# Altium footprint library ref-packages.PCBLIB: 1544 footprints (part 38 of 103)
Each footprint in its own frame and in the unit in brackets; x right, y up, seen from the top. Pads: shape width x height; smd on the part's side, far side on the other; paste and mask are expansions set on the pad; w line width, h text height; cw(c..) or ccw(c..) is an arc to the next point about the centre after c.
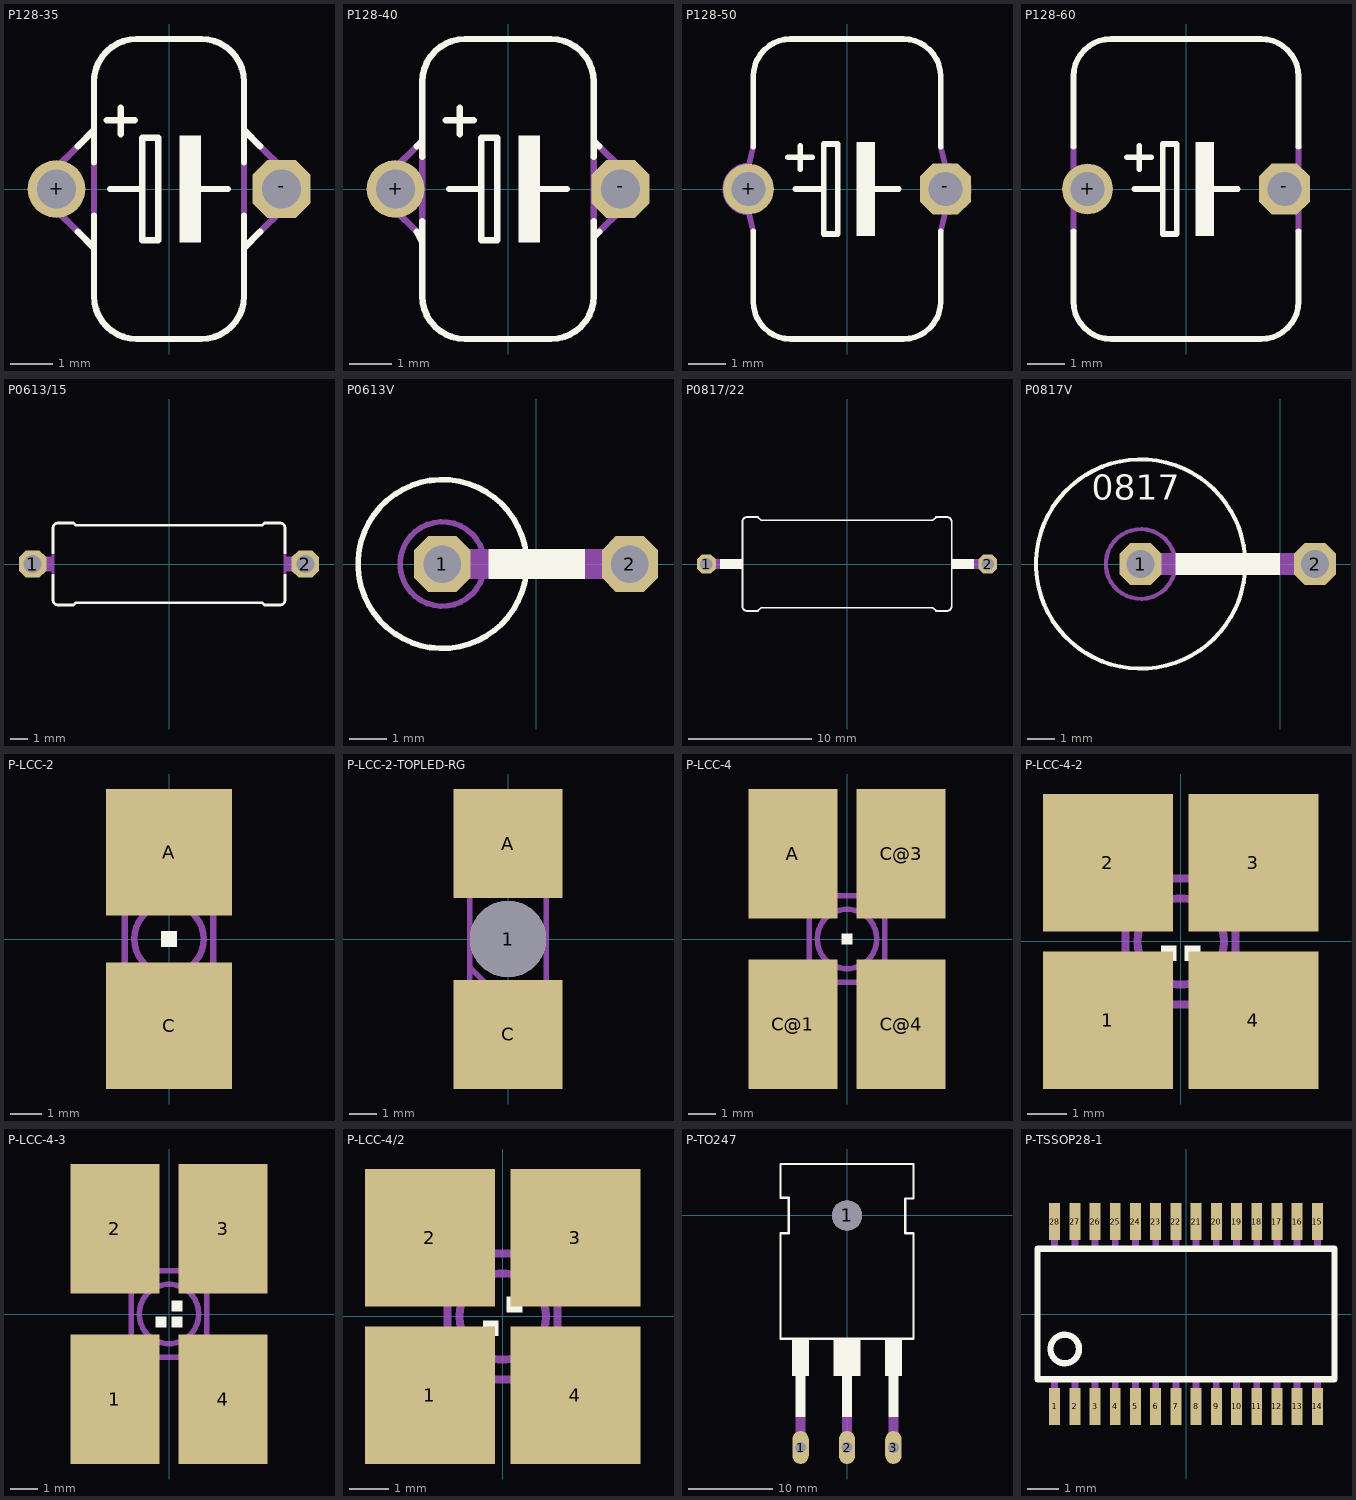
[diagram p37: the footprints below, top view; thin cyan lines are the x and y axes]

## P128-35 [mil]
pads (2):
  round 54 hole 36: +(-105,0)
  oct 54x54 hole 36: -(105,0)
Top Overlay:
  rectangle: 10,-50 30,50
  lines w6: -85,-40 -70,-55 ; -85,40 -70,55 ; -70,-25 -70,-55 ; -70,25 -70,55 ; -70,105 -70,100 ; -58,64 -32,64 ; -55,0 -25,0 ; -45,51 -45,76 ; 25,0 55,0 ; 70,-25 70,-55 ; 70,25 70,55 ; 85,-40 70,-55 ; 85,40 70,55 ; -70,-55 -70,-100 ccw(c-30,-100) -30,-140 30,-140 ccw(c30,-100) 70,-100 70,-55 ; -70,55 -70,100 ; -70,100 cw(c-30,100) -30,140 30,140 cw(c30,100) 70,100 70,55 ; -25,0 -25,-48 -10,-48 -10,48 -25,48 -25,0
Mechanical 16:
  lines w6: -85,-40 -105,-20 cw(c-105,0) -105,20 -85,40 ; -70,-25 -70,25 ; 70,-25 70,25 ; 85,-40 105,-20 ccw(c105,0) 105,20 85,40

## P128-40 [mil]
pads (2):
  round 54 hole 36: +(-105,0)
  oct 54x54 hole 36: -(105,0)
Top Overlay:
  rectangle: 10,-50 30,50
  lines w6: -85,-40 -80,-50 ; -85,40 -80,45 ; -80,-30 -80,-50 ; -80,30 -80,45 ; -58,64 -32,64 ; -55,0 -25,0 ; -45,51 -45,76 ; 25,0 55,0 ; 80,-30 80,-45 ; 80,30 80,45 ; 85,-40 80,-45 ; 85,40 80,45 ; -80,-50 -80,-100 ccw(c-40,-100) -40,-140 40,-140 ccw(c40,-100) 80,-100 80,-45 ; -80,45 -80,100 cw(c-40,100) -40,140 40,140 cw(c40,100) 80,100 80,45 ; -25,0 -25,-48 -10,-48 -10,48 -25,48 -25,0
Mechanical 16:
  lines w6: -85,-40 -105,-20 cw(c-105,0) -105,20 -85,40 ; -80,-30 -80,30 ; 80,-30 80,30 ; 85,-40 105,-20 ccw(c105,0) 105,20 85,40

## P128-50 [mil]
pads (2):
  round 54 hole 36: +(-105,0)
  oct 54x54 hole 36: -(105,0)
Top Overlay:
  rectangle: 10,-50 30,50
  lines w6: -100,-45 -100,-120 ccw(c-60,-120) -60,-160 60,-160 ccw(c60,-120) 100,-120 100,-45 ; -100,45 -100,120 cw(c-60,120) -60,160 60,160 cw(c60,120) 100,120 100,45 ; -63,34 -37,34 ; -55,0 -25,0 ; -50,21 -50,46 ; 25,0 55,0 ; -25,0 -25,-48 -10,-48 -10,48 -25,48 -25,0
Mechanical 16:
  lines w6: -100,-45 -105,-25 cw(c-105,0) -105,25 -100,45 ; 100,-45 105,-25 ccw(c105,0) 105,25 100,45

## P128-60 [mil]
pads (2):
  round 54 hole 36: +(-105,0)
  oct 54x54 hole 36: -(105,0)
Top Overlay:
  rectangle: 10,-50 30,50
  lines w6: -120,-45 -120,-120 ccw(c-80,-120) -80,-160 80,-160 ccw(c80,-120) 120,-120 120,-45 ; -120,45 -120,120 cw(c-80,120) -80,160 80,160 cw(c80,120) 120,120 120,45 ; -63,34 -37,34 ; -55,0 -25,0 ; -50,21 -50,46 ; 25,0 55,0 ; -25,0 -25,-48 -10,-48 -10,48 -25,48 -25,0
Mechanical 16:
  lines w6: -120,-45 -120,45 ; 120,-45 120,45

## P0613/15 [mil]
pads (2):
  oct 60x60 hole 40: 1(-300,0) 2(300,0)
Top Overlay:
  lines w6: -255,-25 -255,-80 ccw(c-245,-80) -245,-90 -210,-90 -205,-85 205,-85 210,-90 245,-90 ccw(c245,-80) 255,-80 255,-25 ; -255,25 -255,80 cw(c-245,80) -245,90 -210,90 -205,85 205,85 210,90 245,90 cw(c245,80) 255,80 255,25
Mechanical 16:
  rectangle: -277,-16 -255,16
  rectangle: 255,-16 277,16
  lines w6: -255,-25 -255,25 ; 255,-25 255,25
  lines w32: -300,0 -275,0 ; 275,0 300,0

## P0613V [mil]
pads (2):
  oct 60x60 hole 40: 1(-100,0) 2(100,0)
Top Overlay:
  circle w6: c-100,0 r90
  rectangle: -51,-16 52,16
Mechanical 16:
  circle w6: c-100,0 r45
  lines w32: -100,0 -55,0 ; 55,0 100,0

## P0817/22 [mil]
pads (2):
  oct 60x60 hole 40: 1(-450,0) 2(450,0)
Top Overlay:
  rectangle: 335,-16 406,16
  rectangle: -406,-16 -335,16
  lines w6: -335,-135 -335,135 cw(c-320,135) -320,150 -285,150 -275,140 275,140 285,150 320,150 cw(c320,135) 335,135 335,-135 cw(c320,-135) 320,-150 285,-150 275,-140 -275,-140 -285,-150 -320,-150 cw(c-320,-135) -335,-135
Mechanical 16:
  lines w32: -450,0 -410,0 ; 410,0 450,0
  text "0817" at 260,-89 h77.5

## P0817V [mil]
pads (2):
  oct 60x60 hole 40: 1(-200,0) 2(50,0)
Top Overlay:
  circle w6: c-200,0 r150
  rectangle: -150,-16 0,16
  text "0817" at -270,80 h62
Mechanical 16:
  circle w6: c-200,0 r50
  lines w32: -200,0 -150,0 ; 0,0 50,0

## P-LCC-2 [mm]
pads (2):
  rect 4x4 smd: A(0,2.75) C(0,-2.75)
Top Overlay:
  rectangle: -0.25,-0.25 0.25,0.25
  text "A" at -0.635,2.54 h1.97
  text "C" at -0.635,-3.81 h1.97
Top Paste:
  rectangle: -1.3,-2.25 1.3,-0.75
  rectangle: -1.3,0.75 1.3,2.25
Mechanical 16:
  circle w0.203: c0,0 r1.1
  lines w0.102: -1.1,-1.6 -1.1,-1.8 1.1,-1.8 1.1,-1.6 ; -1.1,1.6 -1.1,1.8 1.1,1.8 1.1,1.6
  lines w0.203: -1.4,-1.05 -1.4,-1.6 -1.1,-1.6 -0.85,-1.6 ; -1.4,-1.05 -0.85,-1.6 ; -1.4,-1.05 -1.4,1.6 -1.1,1.6 1.1,1.6 1.4,1.6 1.4,-1.6 1.1,-1.6 -0.85,-1.6

## P-LCC-2-TOPLED-RG [mm]
pads (3):
  round 2.8 hole 2.8: 1(0,0)
  rect 4x4 smd: A(0,3.5) C(0,-3.5)
Top Overlay:
  circle w0.203: c0,0 r1.1
  rectangle: -0.25,-0.25 0.25,0.25
  text "A" at -0.635,3.29 h1.97
  text "C" at -0.635,-4.56 h1.97
Top Paste:
  rectangle: -1.3,-3 1.3,-1.5
  rectangle: -1.3,1.5 1.3,3
Mechanical 16:
  rectangle: -1.15,2.4 1.15,2.7
  rectangle: -1.15,-2.7 1.15,-2.4
  lines w0.102: -1.1,-2.45 -1.1,-1.6 ; -1.1,1.6 -1.1,2.45 ; 1.1,-2.45 1.1,-1.6 ; 1.1,1.6 1.1,2.45
  lines w0.203: -1.4,-1.05 -1.4,-1.6 -1.1,-1.6 -0.85,-1.6 ; -1.4,-1.05 -0.85,-1.6 ; -1.4,-1.05 -1.4,1.6 -1.1,1.6 1.1,1.6 1.4,1.6 1.4,-1.6 1.1,-1.6 -0.85,-1.6

## P-LCC-4 [mm]
pads (4):
  rect 3.3x4.8 smd: A(-2,3.15) C@1(-2,-3.15) C@3(2,3.15) C@4(2,-3.15)
Top Overlay:
  rectangle: -0.2,-0.2 0.2,0.2
Top Paste:
  rectangle: -1.1,-1.8 -0.4,-0.8
  rectangle: 0.4,-1.8 1.1,-0.8
  rectangle: 0.4,0.8 1.1,1.8
  rectangle: -1.1,0.8 -0.4,1.8
Top Solder:
  rectangle: -1.15,0.75 -0.35,1.85
  rectangle: 0.35,0.75 1.15,1.85
  rectangle: 0.35,-1.85 1.15,-0.75
  rectangle: -1.15,-1.85 -0.35,-0.75
Mechanical 16:
  circle w0.203: c0,0 r1.1
  lines w0.102: -1,-1.6 -1,-1.8 -0.5,-1.8 -0.5,-1.65 ; -1,1.6 -1,1.8 -0.5,1.8 -0.5,1.65 ; 0.5,-1.65 0.5,-1.8 1,-1.8 1,-1.6 ; 0.5,1.65 0.5,1.8 1.1,1.8 1.1,1.6
  lines w0.203: -1.4,-1.05 -1.4,-1.6 -1,-1.6 -0.85,-1.6 ; -1.4,-1.05 -0.85,-1.6 ; -1.4,-1.05 -1.4,1.6 -1,1.6 1.1,1.6 1.4,1.6 1.4,-1.6 1,-1.6 -0.85,-1.6
  text "C" at -1.905,-3.81 h1.97
  text "A" at -1.905,2.54 h1.97
  text "C" at 1.27,2.54 h1.97
  text "C" at 1.27,-3.81 h1.97

## P-LCC-4-2 [mm]
pads (4):
  rect 3.3x3.5 smd: 1(-1.85,-2) 2(-1.85,2) 3(1.85,2) 4(1.85,-2)
Top Overlay:
  rectangle: 0.1,-0.5 0.5,-0.1
  rectangle: -0.5,-0.5 -0.1,-0.1
  text "1" at -2.54,-2.54 h1.97
  text "2" at -2.54,1.905 h1.97
  text "3" at 1.905,1.905 h1.97
  text "4" at 1.905,-2.54 h1.97
Top Paste:
  rectangle: -1.1,-1.8 -0.4,-0.8
  rectangle: 0.4,-1.8 1.1,-0.8
  rectangle: 0.4,0.8 1.1,1.8
  rectangle: -1.1,0.8 -0.4,1.8
Top Solder:
  rectangle: -1.15,0.75 -0.35,1.85
  rectangle: 0.35,0.75 1.15,1.85
  rectangle: 0.35,-1.85 1.15,-0.75
  rectangle: -1.15,-1.85 -0.35,-0.75
Mechanical 16:
  circle w0.203: c0,0 r1.1
  lines w0.102: -1,-1.6 -1,-1.8 -0.5,-1.8 -0.5,-1.65 ; -1,1.6 -1,1.8 -0.5,1.8 -0.5,1.65 ; 0.5,-1.65 0.5,-1.8 1,-1.8 1,-1.6 ; 0.5,1.65 0.5,1.8 1.1,1.8 1.1,1.6
  lines w0.203: -1.4,-1.05 -1.4,-1.6 -1,-1.6 -0.85,-1.6 ; -1.4,-1.05 -0.85,-1.6 ; -1.4,-1.05 -1.4,1.6 -1,1.6 1.1,1.6 1.4,1.6 1.4,-1.6 1,-1.6 -0.85,-1.6

## P-LCC-4-3 [mm]
pads (4):
  rect 3.3x4.8 smd: 1(-2,-3.15) 2(-2,3.15) 3(2,3.15) 4(2,-3.15)
Top Overlay:
  rectangle: 0.1,0.1 0.5,0.5
  rectangle: 0.1,-0.5 0.5,-0.1
  rectangle: -0.5,-0.5 -0.1,-0.1
  text "1" at -1.905,-3.81 h1.97
  text "2" at -1.905,2.54 h1.97
  text "3" at 1.27,2.54 h1.97
  text "4" at 1.27,-3.81 h1.97
Top Paste:
  rectangle: -1.1,-1.8 -0.4,-0.8
  rectangle: 0.4,-1.8 1.1,-0.8
  rectangle: 0.4,0.8 1.1,1.8
  rectangle: -1.1,0.8 -0.4,1.8
Top Solder:
  rectangle: -1.15,0.75 -0.35,1.85
  rectangle: 0.35,0.75 1.15,1.85
  rectangle: 0.35,-1.85 1.15,-0.75
  rectangle: -1.15,-1.85 -0.35,-0.75
Mechanical 16:
  circle w0.203: c0,0 r1.1
  lines w0.102: -1,-1.6 -1,-1.8 -0.5,-1.8 -0.5,-1.65 ; -1,1.6 -1,1.8 -0.5,1.8 -0.5,1.65 ; 0.5,-1.65 0.5,-1.8 1,-1.8 1,-1.6 ; 0.5,1.65 0.5,1.8 1.1,1.8 1.1,1.6
  lines w0.203: -1.4,-1.05 -1.4,-1.6 -1,-1.6 -0.85,-1.6 ; -1.4,-1.05 -0.85,-1.6 ; -1.4,-1.05 -1.4,1.6 -1,1.6 1.1,1.6 1.4,1.6 1.4,-1.6 1,-1.6 -0.85,-1.6

## P-LCC-4/2 [mm]
pads (4):
  rect 3.3x3.5 smd: 1(-1.85,-2) 2(-1.85,2) 3(1.85,2) 4(1.85,-2)
Top Overlay:
  rectangle: 0.1,0.1 0.5,0.5
  rectangle: -0.5,-0.5 -0.1,-0.1
  text "1" at -2.54,-2.54 h1.97
  text "2" at -2.54,1.905 h1.97
  text "3" at 1.905,1.905 h1.97
  text "4" at 1.905,-2.54 h1.97
Top Paste:
  rectangle: -1.1,-1.8 -0.4,-0.8
  rectangle: 0.4,-1.8 1.1,-0.8
  rectangle: 0.4,0.8 1.1,1.8
  rectangle: -1.1,0.8 -0.4,1.8
Top Solder:
  rectangle: -1.15,0.75 -0.35,1.85
  rectangle: 0.35,0.75 1.15,1.85
  rectangle: 0.35,-1.85 1.15,-0.75
  rectangle: -1.15,-1.85 -0.35,-0.75
Mechanical 16:
  circle w0.203: c0,0 r1.1
  lines w0.102: -1,-1.6 -1,-1.8 -0.5,-1.8 -0.5,-1.65 ; -1,1.6 -1,1.8 -0.5,1.8 -0.5,1.65 ; 0.5,-1.65 0.5,-1.8 1,-1.8 1,-1.6 ; 0.5,1.65 0.5,1.8 1.1,1.8 1.1,1.6
  lines w0.203: -1.4,-1.05 -1.4,-1.6 -1,-1.6 -0.85,-1.6 ; -1.4,-1.05 -0.85,-1.6 ; -1.4,-1.05 -1.4,1.6 -1,1.6 1.1,1.6 1.4,1.6 1.4,-1.6 1,-1.6 -0.85,-1.6

## P-TO247 [mil]
pads (4):
  oval 76.77x153.54 hole 51.18: 1(-216.54,-1082.68) 2(0,-1082.68) 3(216.54,-1082.68)
  round 141.73 hole 141.73: 1(0,0)
Top Overlay:
  rectangle: -62.99,-748.03 62.99,-578.74
  rectangle: -255.91,-748.03 -177.17,-578.74
  rectangle: 177.17,-748.03 255.91,-578.74
  rectangle: -240.16,-940.94 -192.91,-748.03
  rectangle: -23.62,-940.94 23.62,-748.03
  rectangle: 192.91,-940.94 240.16,-748.03
  lines w10: -311.02,-574.8 311.02,-574.8 311.02,-82.68 271.65,-82.68 271.65,78.74 311.02,78.74 311.02,240.16 -311.02,240.16 -311.02,82.68 -271.65,82.68 -271.65,-82.68 -311.02,-82.68 -311.02,-574.8
Mechanical 16:
  rectangle: -23.62,-1082.68 23.62,-940.94
  rectangle: 192.91,-1082.68 240.16,-940.94
  rectangle: -240.16,-1082.68 -192.91,-940.94

## P-TSSOP28-1 [mm]
pads (28):
  rect 0.35x1.2 smd: 1(-4.225,-2.975) 2(-3.575,-2.975) 3(-2.925,-2.975) 4(-2.275,-2.975) 5(-1.625,-2.975) 6(-0.975,-2.975) 7(-0.325,-2.975) 8(0.325,-2.975) 9(0.975,-2.975) 10(1.625,-2.975) 11(2.275,-2.975) 12(2.925,-2.975) 13(3.575,-2.975) 14(4.225,-2.975) 15(4.225,2.975) 16(3.575,2.975) 17(2.925,2.975) 18(2.275,2.975) 19(1.625,2.975) 20(0.975,2.975) 21(0.325,2.975) 22(-0.325,2.975) 23(-0.975,2.975) 24(-1.625,2.975) 25(-2.275,2.975) 26(-2.925,2.975) 27(-3.575,2.975) 28(-4.225,2.975)
Top Overlay:
  circle w0.203: c-3.9,-1.125 r0.459
  lines w0.203: -4.775,-2.1 4.775,-2.1 4.775,2.1 -4.775,2.1 -4.775,-2.1
Mechanical 16:
  rectangle: -4.335,-3.2 -4.115,-2.17
  rectangle: -3.685,-3.2 -3.465,-2.17
  rectangle: -3.035,-3.2 -2.815,-2.17
  rectangle: -2.385,-3.2 -2.165,-2.17
  rectangle: -1.735,-3.2 -1.515,-2.17
  rectangle: -1.085,-3.2 -0.865,-2.17
  rectangle: -0.435,-3.2 -0.215,-2.17
  rectangle: 0.215,-3.2 0.435,-2.17
  rectangle: 0.865,-3.2 1.085,-2.17
  rectangle: 1.515,-3.2 1.735,-2.17
  rectangle: 2.165,-3.2 2.385,-2.17
  rectangle: 2.815,-3.2 3.035,-2.17
  rectangle: 3.465,-3.2 3.685,-2.17
  rectangle: 4.115,-3.2 4.335,-2.17
  rectangle: 4.115,2.17 4.335,3.2
  rectangle: 3.465,2.17 3.685,3.2
  rectangle: 2.815,2.17 3.035,3.2
  rectangle: 2.165,2.17 2.385,3.2
  rectangle: 1.515,2.17 1.735,3.2
  rectangle: 0.865,2.17 1.085,3.2
  rectangle: 0.215,2.17 0.435,3.2
  rectangle: -0.435,2.17 -0.215,3.2
  rectangle: -1.085,2.17 -0.865,3.2
  rectangle: -1.735,2.17 -1.515,3.2
  rectangle: -2.385,2.17 -2.165,3.2
  rectangle: -3.035,2.17 -2.815,3.2
  rectangle: -3.685,2.17 -3.465,3.2
  rectangle: -4.335,2.17 -4.115,3.2